# Altium footprint library Molex FFC - FPC Connectors (SMT).PcbLib: 638 footprints (part 24 of 40)
Each footprint in its own frame and in the unit in brackets; x right, y up, seen from the top. Pads: shape width x height; smd on the part's side, far side on the other; paste and mask are expansions set on the pad; w line width, h text height; cw(c..) or ccw(c..) is an arc to the next point about the centre after c.
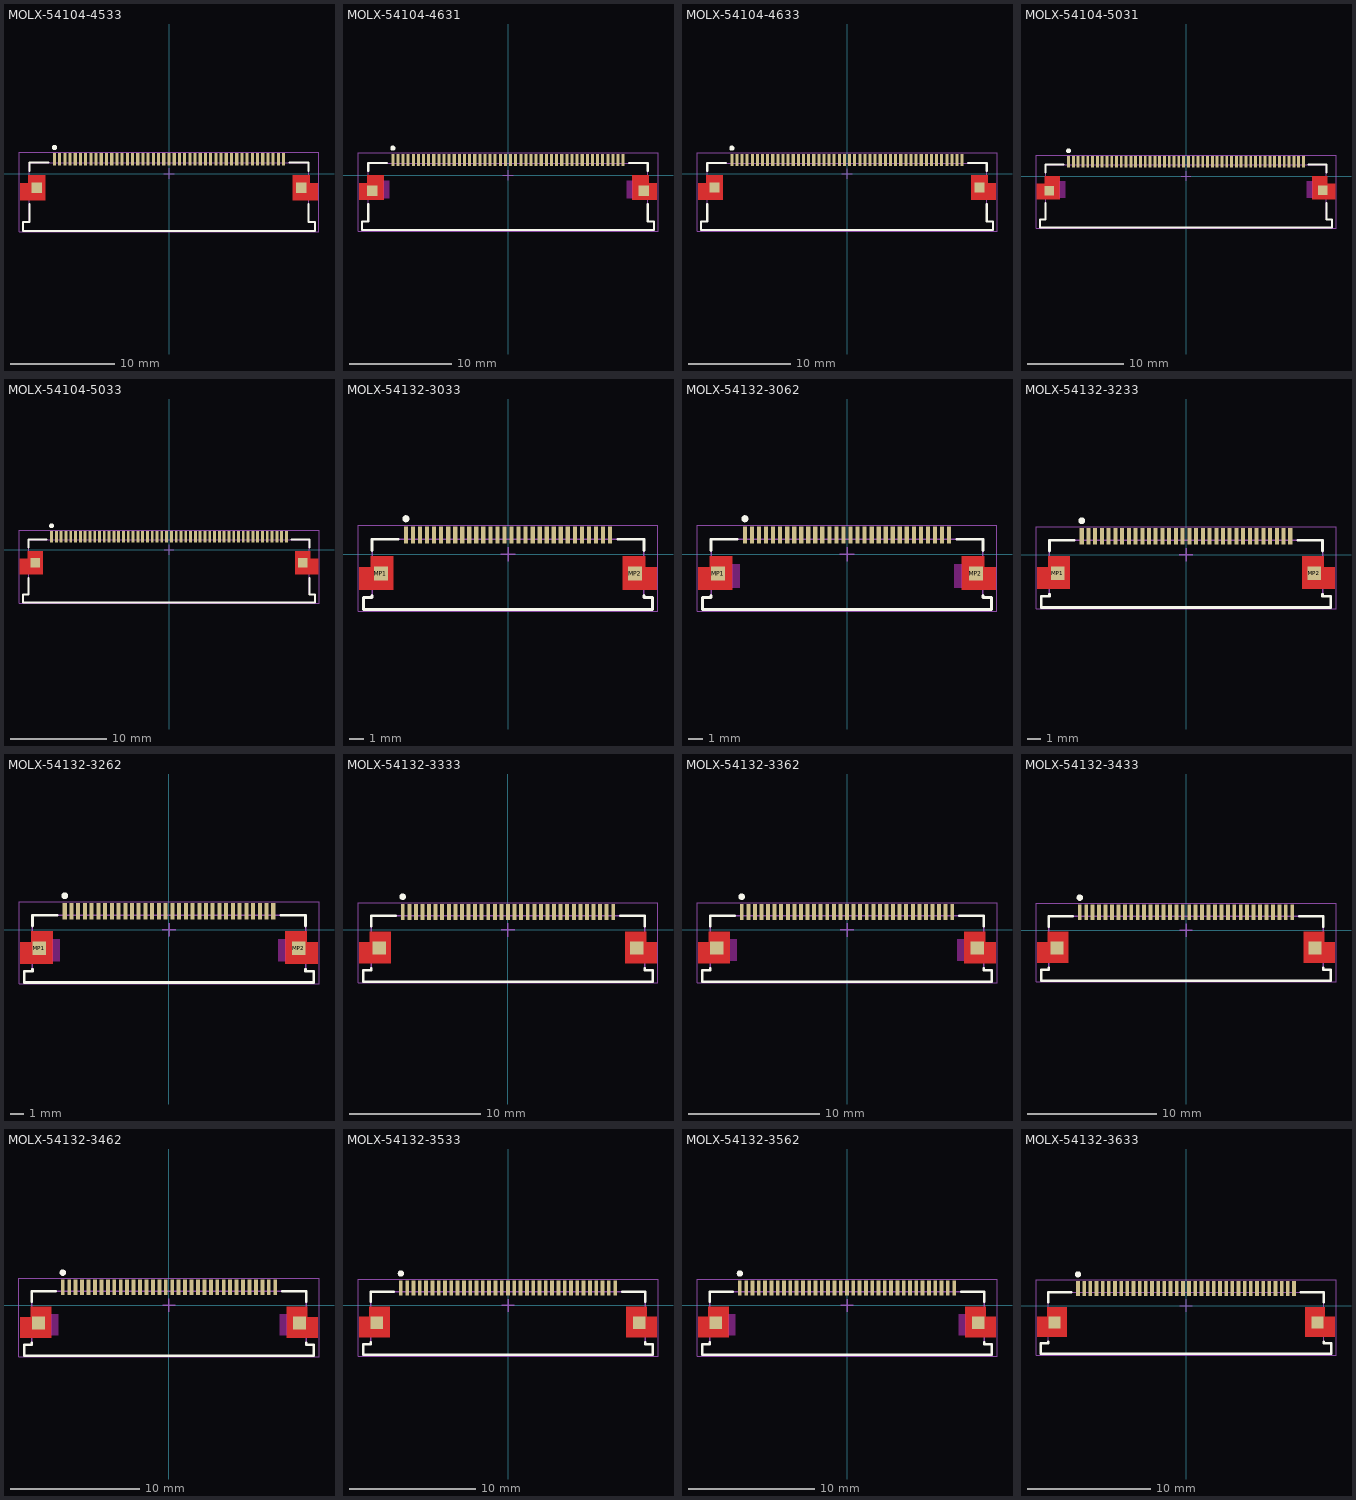
[diagram p23: the footprints below, top view; thin cyan lines are the x and y axes]

## MOLX-54104-4533 [mm] "FPC Connector, 45-Leads, Right Angle, Pitch 0.5 mm, Mated Height 2.0 mm, SMT"
height 2.062
pads (47):
  rect 0.3x1.2 smd: 1(-11,1.35) 2(-10.5,1.35) 3(-10,1.35) 4(-9.5,1.35) 5(-9,1.35) 6(-8.5,1.35) 7(-8,1.35) 8(-7.5,1.35) 9(-7,1.35) 10(-6.5,1.35) 11(-6,1.35) 12(-5.5,1.35) 13(-5,1.35) 14(-4.5,1.35) 15(-4,1.35) 16(-3.5,1.35) 17(-3,1.35) 18(-2.5,1.35) 19(-2,1.35) 20(-1.5,1.35) 21(-1,1.35) 22(-0.5,1.35) 23(0,1.35) 24(0.5,1.35) 25(1,1.35) 26(1.5,1.35) 27(2,1.35) 28(2.5,1.35) 29(3,1.35) 30(3.5,1.35) 31(4,1.35) 32(4.5,1.35) 33(5,1.35) 34(5.5,1.35) 35(6,1.35) 36(6.5,1.35) 37(7,1.35) 38(7.5,1.35) 39(8,1.35) 40(8.5,1.35) 41(9,1.35) 42(9.5,1.35) 43(10,1.35) 44(10.5,1.35) 45(11,1.35)
  rect 1x1 smd mask+0: MP1(-12.7,-1.35) MP2(12.7,-1.35)
Top Layer:
  region: 11.9,-2.55 11.9,-0.15 13.5,-0.15 13.5,-0.95 14.3,-0.95 14.3,-2.55
  region: -11.9,-2.55 -11.9,-0.15 -13.5,-0.15 -13.5,-0.95 -14.3,-0.95 -14.3,-2.55
Top Overlay:
  circle w0.25: c-11,2.5 r0.125
  lines w0.2: -13.4,-2.95 -13.4,-4.65 -14,-4.65 -14,-5.5 14,-5.5 14,-4.65 13.4,-4.65 13.4,-2.95 ; -13.4,0.25 -13.4,1.05 -11.55,1.05 ; 11.55,1.05 13.4,1.05 13.4,0.25
Mechanical 13:
  lines w0.1: -14,-5.5 14,-5.5 14,-4.65 13.4,-4.65 13.4,1.05 -13.4,1.05 -13.4,-4.65 -14,-4.65 -14,-5.5
Mechanical 15:
  lines w0.05: -14.4,-5.6 14.4,-5.6 14.4,2.05 -14.4,2.05 -14.4,-5.6
  lines w0.1: -0.5,0 0.5,0 ; 0,-0.5 0,0.5
3D body: height 0.25, standoff 0, extent -14,-5.5 14,1.65

## MOLX-54104-4631 [mm] "FPC Connector, 46-Leads, Right Angle, Pitch 0.5 mm, Mated Height 2.0 mm, SMT"
height 2.062
pads (48):
  rect 0.3x1.2 smd: 1(-11.25,1.5) 2(-10.75,1.5) 3(-10.25,1.5) 4(-9.75,1.5) 5(-9.25,1.5) 6(-8.75,1.5) 7(-8.25,1.5) 8(-7.75,1.5) 9(-7.25,1.5) 10(-6.75,1.5) 11(-6.25,1.5) 12(-5.75,1.5) 13(-5.25,1.5) 14(-4.75,1.5) 15(-4.25,1.5) 16(-3.75,1.5) 17(-3.25,1.5) 18(-2.75,1.5) 19(-2.25,1.5) 20(-1.75,1.5) 21(-1.25,1.5) 22(-0.75,1.5) 23(-0.25,1.5) 24(0.25,1.5) 25(0.75,1.5) 26(1.25,1.5) 27(1.75,1.5) 28(2.25,1.5) 29(2.75,1.5) 30(3.25,1.5) 31(3.75,1.5) 32(4.25,1.5) 33(4.75,1.5) 34(5.25,1.5) 35(5.75,1.5) 36(6.25,1.5) 37(6.75,1.5) 38(7.25,1.5) 39(7.75,1.5) 40(8.25,1.5) 41(8.75,1.5) 42(9.25,1.5) 43(9.75,1.5) 44(10.25,1.5) 45(10.75,1.5) 46(11.25,1.5)
  rect 1x1 smd: MP1(-13.25,-1.5) MP2(13.25,-1.5)
Top Layer:
  region: -12.15,0 -13.75,0 -13.75,-0.8 -14.55,-0.8 -14.55,-2.4 -12.15,-2.4
  region: 12.15,0 13.75,0 13.75,-0.8 14.55,-0.8 14.55,-2.4 12.15,-2.4
Top Overlay:
  circle w0.25: c-11.25,2.65 r0.125
  lines w0.2: -14.25,-5.35 14.25,-5.35 14.25,-4.5 13.65,-4.5 13.65,-2.8 ; -14.25,-5.35 -14.25,-4.5 -13.65,-4.5 -13.65,-2.8 ; -13.65,0.4 -13.65,1.2 -11.8,1.2 ; 11.8,1.2 13.65,1.2 13.65,0.4
Keep-Out Layer:
  region: -11.6,-0.55 -12.15,-0.55 -12.15,-2.25 -11.6,-2.25
  region: 12.15,-0.55 11.6,-0.55 11.6,-2.25 12.15,-2.25
Mechanical 13:
  lines w0.1: -14.25,-5.35 14.25,-5.35 14.25,-4.5 13.65,-4.5 13.65,1.2 -13.65,1.2 -13.65,-4.5 -14.25,-4.5 -14.25,-5.35
Mechanical 15:
  lines w0.05: -14.65,-5.45 -14.65,2.2 14.65,2.2 14.65,-5.45 -14.65,-5.45
  lines w0.1: -0.5,0 0.5,0 ; 0,-0.5 0,0.5
3D body: height 0.25, standoff 0, extent -14.25,-5.35 14.25,1.8

## MOLX-54104-4633 [mm] "FPC Connector, 46-Leads, Right Angle, Pitch 0.5 mm, Mated Height 2.0 mm, SMT"
height 2.062
pads (48):
  rect 0.3x1.2 smd: 1(-11.25,1.35) 2(-10.75,1.35) 3(-10.25,1.35) 4(-9.75,1.35) 5(-9.25,1.35) 6(-8.75,1.35) 7(-8.25,1.35) 8(-7.75,1.35) 9(-7.25,1.35) 10(-6.75,1.35) 11(-6.25,1.35) 12(-5.75,1.35) 13(-5.25,1.35) 14(-4.75,1.35) 15(-4.25,1.35) 16(-3.75,1.35) 17(-3.25,1.35) 18(-2.75,1.35) 19(-2.25,1.35) 20(-1.75,1.35) 21(-1.25,1.35) 22(-0.75,1.35) 23(-0.25,1.35) 24(0.25,1.35) 25(0.75,1.35) 26(1.25,1.35) 27(1.75,1.35) 28(2.25,1.35) 29(2.75,1.35) 30(3.25,1.35) 31(3.75,1.35) 32(4.25,1.35) 33(4.75,1.35) 34(5.25,1.35) 35(5.75,1.35) 36(6.25,1.35) 37(6.75,1.35) 38(7.25,1.35) 39(7.75,1.35) 40(8.25,1.35) 41(8.75,1.35) 42(9.25,1.35) 43(9.75,1.35) 44(10.25,1.35) 45(10.75,1.35) 46(11.25,1.35)
  rect 1x1 smd mask+0: MP1(-12.95,-1.35) MP2(12.95,-1.35)
Top Layer:
  region: 12.15,-2.55 12.15,-0.15 13.75,-0.15 13.75,-0.95 14.55,-0.95 14.55,-2.55
  region: -12.15,-2.55 -12.15,-0.15 -13.75,-0.15 -13.75,-0.95 -14.55,-0.95 -14.55,-2.55
Top Overlay:
  circle w0.25: c-11.25,2.5 r0.125
  lines w0.2: -13.65,-2.95 -13.65,-4.65 -14.25,-4.65 -14.25,-5.5 14.25,-5.5 14.25,-4.65 13.65,-4.65 13.65,-2.95 ; -13.65,0.25 -13.65,1.05 -11.8,1.05 ; 11.8,1.05 13.65,1.05 13.65,0.25
Mechanical 13:
  lines w0.1: -14.25,-5.5 14.25,-5.5 14.25,-4.65 13.65,-4.65 13.65,1.05 -13.65,1.05 -13.65,-4.65 -14.25,-4.65 -14.25,-5.5
Mechanical 15:
  lines w0.05: -14.65,-5.6 14.65,-5.6 14.65,2.05 -14.65,2.05 -14.65,-5.6
  lines w0.1: -0.5,0 0.5,0 ; 0,-0.5 0,0.5
3D body: height 0.25, standoff 0, extent -14.25,-5.5 14.25,1.65

## MOLX-54104-5031 [mm] "FPC Connector, 50-Leads, Right Angle, Pitch 0.5 mm, Mated Height 2.0 mm, SMT"
height 2.062
pads (52):
  rect 0.3x1.2 smd: 1(-12.25,1.5) 2(-11.75,1.5) 3(-11.25,1.5) 4(-10.75,1.5) 5(-10.25,1.5) 6(-9.75,1.5) 7(-9.25,1.5) 8(-8.75,1.5) 9(-8.25,1.5) 10(-7.75,1.5) 11(-7.25,1.5) 12(-6.75,1.5) 13(-6.25,1.5) 14(-5.75,1.5) 15(-5.25,1.5) 16(-4.75,1.5) 17(-4.25,1.5) 18(-3.75,1.5) 19(-3.25,1.5) 20(-2.75,1.5) 21(-2.25,1.5) 22(-1.75,1.5) 23(-1.25,1.5) 24(-0.75,1.5) 25(-0.25,1.5) 26(0.25,1.5) 27(0.75,1.5) 28(1.25,1.5) 29(1.75,1.5) 30(2.25,1.5) 31(2.75,1.5) 32(3.25,1.5) 33(3.75,1.5) 34(4.25,1.5) 35(4.75,1.5) 36(5.25,1.5) 37(5.75,1.5) 38(6.25,1.5) 39(6.75,1.5) 40(7.25,1.5) 41(7.75,1.5) 42(8.25,1.5) 43(8.75,1.5) 44(9.25,1.5) 45(9.75,1.5) 46(10.25,1.5) 47(10.75,1.5) 48(11.25,1.5) 49(11.75,1.5) 50(12.25,1.5)
  rect 1x1 smd: MP1(-14.25,-1.5) MP2(14.25,-1.475)
Top Layer:
  region: 13.15,0 14.75,0 14.75,-0.8 15.55,-0.8 15.55,-2.4 13.15,-2.4
  region: -13.15,0 -14.75,0 -14.75,-0.8 -15.55,-0.8 -15.55,-2.4 -13.15,-2.4
Top Overlay:
  circle w0.25: c-12.25,2.65 r0.125
  lines w0.2: -15.25,-5.35 15.25,-5.35 15.25,-4.5 14.65,-4.5 14.65,-2.8 ; -15.25,-5.35 -15.25,-4.5 -14.65,-4.5 -14.65,-2.8 ; -14.65,0.4 -14.65,1.2 -12.8,1.2 ; 12.8,1.2 14.65,1.2 14.65,0.4
Keep-Out Layer:
  region: 13.15,-0.55 12.6,-0.55 12.6,-2.25 13.15,-2.25
  region: -12.6,-0.55 -13.15,-0.55 -13.15,-2.25 -12.6,-2.25
Mechanical 13:
  lines w0.1: -15.25,-5.35 -15.25,-4.5 -14.65,-4.5 -14.65,1.2 14.65,1.2 14.65,-4.5 15.25,-4.5 15.25,-5.35 -15.25,-5.35
Mechanical 15:
  lines w0.05: -15.65,-5.45 15.65,-5.45 15.65,2.2 -15.65,2.2 -15.65,-5.45
  lines w0.1: -0.5,0 0.5,0 ; 0,-0.5 0,0.5
3D body: height 0.25, standoff 0, extent -15.25,-5.35 15.25,1.8

## MOLX-54104-5033 [mm] "FPC Connector, 50-Leads, Right Angle, Pitch 0.5 mm, Mated Height 2.0 mm, SMT"
height 2.062
pads (52):
  rect 0.3x1.2 smd: 1(-12.25,1.35) 2(-11.75,1.35) 3(-11.25,1.35) 4(-10.75,1.35) 5(-10.25,1.35) 6(-9.75,1.35) 7(-9.25,1.35) 8(-8.75,1.35) 9(-8.25,1.35) 10(-7.75,1.35) 11(-7.25,1.35) 12(-6.75,1.35) 13(-6.25,1.35) 14(-5.75,1.35) 15(-5.25,1.35) 16(-4.75,1.35) 17(-4.25,1.35) 18(-3.75,1.35) 19(-3.25,1.35) 20(-2.75,1.35) 21(-2.25,1.35) 22(-1.75,1.35) 23(-1.25,1.35) 24(-0.75,1.35) 25(-0.25,1.35) 26(0.25,1.35) 27(0.75,1.35) 28(1.25,1.35) 29(1.75,1.35) 30(2.25,1.35) 31(2.75,1.35) 32(3.25,1.35) 33(3.75,1.35) 34(4.25,1.35) 35(4.75,1.35) 36(5.25,1.35) 37(5.75,1.35) 38(6.25,1.35) 39(6.75,1.35) 40(7.25,1.35) 41(7.75,1.35) 42(8.25,1.35) 43(8.75,1.35) 44(9.25,1.35) 45(9.75,1.35) 46(10.25,1.35) 47(10.75,1.35) 48(11.25,1.35) 49(11.75,1.35) 50(12.25,1.35)
  rect 1x1 smd mask+0: MP1(-13.95,-1.35) MP2(13.95,-1.35)
Top Layer:
  region: -13.15,-2.55 -13.15,-0.15 -14.75,-0.15 -14.75,-0.95 -15.55,-0.95 -15.55,-2.55
  region: 13.15,-2.55 13.15,-0.15 14.75,-0.15 14.75,-0.95 15.55,-0.95 15.55,-2.55
Top Overlay:
  circle w0.25: c-12.25,2.5 r0.125
  lines w0.2: -14.65,-2.95 -14.65,-4.65 -15.25,-4.65 -15.25,-5.5 15.25,-5.5 15.25,-4.65 14.65,-4.65 14.65,-2.95 ; -14.65,0.25 -14.65,1.05 -12.8,1.05 ; 12.8,1.05 14.65,1.05 14.65,0.25
Mechanical 13:
  lines w0.1: -15.25,-5.5 -15.25,-4.65 -14.65,-4.65 -14.65,1.05 14.65,1.05 14.65,-4.65 15.25,-4.65 15.25,-5.5 -15.25,-5.5
Mechanical 15:
  lines w0.05: -15.65,-5.6 -15.65,2.05 15.65,2.05 15.65,-5.6 -15.65,-5.6
  lines w0.1: -0.5,0 0.5,0 ; 0,-0.5 0,0.5
3D body: height 0.25, standoff 0, extent -15.25,-5.5 15.25,1.65

## MOLX-54132-3033 [mm] "FPC Connector, 30-Leads, Right Angle, Pitch 0.5 mm, Mated Height 2.0 mm, SMT"
height 2.002
pads (32):
  rect 0.3x1.2 smd: 1(-7.25,1.373) 2(-6.75,1.373) 3(-6.25,1.373) 4(-5.75,1.373) 5(-5.25,1.373) 6(-4.75,1.373) 7(-4.25,1.373) 8(-3.75,1.373) 9(-3.25,1.373) 10(-2.75,1.373) 11(-2.25,1.373) 12(-1.75,1.373) 13(-1.25,1.373) 14(-0.75,1.373) 15(-0.25,1.373) 16(0.25,1.373) 17(0.75,1.373) 18(1.25,1.373) 19(1.75,1.373) 20(2.25,1.373) 21(2.75,1.373) 22(3.25,1.373) 23(3.75,1.373) 24(4.25,1.373) 25(4.75,1.373) 26(5.25,1.373) 27(5.75,1.373) 28(6.25,1.373) 29(6.75,1.373) 30(7.25,1.373)
  rect 1x1 smd: MP1(-9.017,-1.373) MP2(9.017,-1.373)
Top Layer:
  region: 9.75,-0.126 8.15,-0.126 8.15,-2.526 10.55,-2.526 10.55,-0.927 9.75,-0.927
  region: -9.75,-0.126 -8.15,-0.126 -8.15,-2.526 -10.55,-2.526 -10.55,-0.927 -9.75,-0.927
Top Overlay:
  circle w0.25: c-7.25,2.524 r0.125
  lines w0.2: -9.65,-2.926 -9.65,-3.076 -10.25,-3.076 -10.25,-3.927 10.25,-3.926 ; -9.65,0.274 -9.65,1.074 -7.8,1.074 ; 7.8,1.074 9.65,1.074 9.65,0.274 ; 9.65,-2.926 9.65,-3.076 10.25,-3.076 10.25,-3.926
Mechanical 13:
  lines w0.1: -9.702,-3.076 -10.25,-3.076 -10.25,-3.927 10.25,-3.926 10.25,-3.076 9.65,-3.076 9.65,1.074 -9.65,1.074 -9.65,-3.076
Mechanical 15:
  lines w0.05: -10.65,-4.026 10.65,-4.026 10.65,2.074 -10.65,2.074 -10.65,-4.026
  lines w0.1: -0.5,0 0.5,0 ; 0,-0.5 0,0.5
3D body: height 0.25, standoff 0, extent -10.25,-3.926 10.25,1.674

## MOLX-54132-3062 [mm] "FPC Connector, 30-Leads, Right Angle, Pitch 0.5 mm, Mated Height 2.0 mm, SMT"
height 2.002
pads (32):
  rect 0.3x1.2 smd: 1(-7.25,1.375) 2(-6.75,1.375) 3(-6.25,1.375) 4(-5.75,1.375) 5(-5.25,1.375) 6(-4.75,1.375) 7(-4.25,1.375) 8(-3.75,1.375) 9(-3.25,1.375) 10(-2.75,1.375) 11(-2.25,1.375) 12(-1.75,1.375) 13(-1.25,1.375) 14(-0.75,1.375) 15(-0.25,1.375) 16(0.25,1.375) 17(0.75,1.375) 18(1.25,1.375) 19(1.75,1.375) 20(2.25,1.375) 21(2.75,1.375) 22(3.25,1.375) 23(3.75,1.375) 24(4.25,1.375) 25(4.75,1.375) 26(5.25,1.375) 27(5.75,1.375) 28(6.25,1.375) 29(6.75,1.375) 30(7.25,1.375)
  rect 1x1 smd: MP1(-9.15,-1.375) MP2(9.15,-1.375)
Top Layer:
  region: 8.15,-0.125 9.75,-0.125 9.75,-0.925 10.55,-0.925 10.55,-2.525 8.15,-2.525
  region: -8.15,-0.125 -9.75,-0.125 -9.75,-0.925 -10.55,-0.925 -10.55,-2.525 -8.15,-2.525
Top Overlay:
  circle w0.25: c-7.25,2.525 r0.125
  lines w0.2: -9.65,-2.925 -9.65,-3.075 -10.25,-3.075 -10.25,-3.925 10.25,-3.925 10.25,-3.075 9.65,-3.075 9.65,-2.925 ; -9.65,0.275 -9.65,1.075 -7.8,1.075 ; 7.8,1.075 9.65,1.075 9.65,0.275
Keep-Out Layer:
  rectangle: 7.6,-2.375 8.15,-0.675
  region: -7.6,-0.675 -8.15,-0.675 -8.15,-2.375 -7.6,-2.375
Mechanical 13:
  lines w0.1: -10.25,-3.925 -10.25,-3.075 -9.65,-3.075 -9.65,1.075 9.65,1.075 9.65,-3.075 10.25,-3.075 10.25,-3.925 -10.25,-3.925
Mechanical 15:
  lines w0.05: -10.65,-4.025 10.65,-4.025 10.65,2.075 -10.65,2.075 -10.65,-4.025
  lines w0.1: -0.5,0 0.5,0 ; 0,-0.5 0,0.5
3D body: height 0.25, standoff 0, extent -10.25,-3.925 10.25,1.675

## MOLX-54132-3233 [mm] "FPC Connector, 32-Leads, Right Angle, Pitch 0.5 mm, Mated Height 2.0 mm, SMT"
height 2.002
pads (34):
  rect 0.3x1.2 smd: 1(-7.75,1.373) 2(-7.25,1.373) 3(-6.75,1.373) 4(-6.25,1.373) 5(-5.75,1.373) 6(-5.25,1.373) 7(-4.75,1.373) 8(-4.25,1.373) 9(-3.75,1.373) 10(-3.25,1.373) 11(-2.75,1.373) 12(-2.25,1.373) 13(-1.75,1.373) 14(-1.25,1.373) 15(-0.75,1.373) 16(-0.25,1.373) 17(0.25,1.373) 18(0.75,1.373) 19(1.25,1.373) 20(1.75,1.373) 21(2.25,1.373) 22(2.75,1.373) 23(3.25,1.373) 24(3.75,1.373) 25(4.25,1.373) 26(4.75,1.373) 27(5.25,1.373) 28(5.75,1.373) 29(6.25,1.373) 30(6.75,1.373) 31(7.25,1.373) 32(7.75,1.373)
  rect 1x1 smd: MP1(-9.525,-1.373) MP2(9.525,-1.373)
Top Layer:
  region: -10.25,-0.126 -8.65,-0.126 -8.65,-2.526 -11.05,-2.526 -11.05,-0.927 -10.25,-0.927
  region: 10.25,-0.126 8.65,-0.126 8.65,-2.526 11.05,-2.526 11.05,-0.927 10.25,-0.927
Top Overlay:
  circle w0.25: c-7.75,2.524 r0.125
  lines w0.2: -10.15,-2.926 -10.15,-3.076 -10.75,-3.076 -10.75,-3.927 10.75,-3.926 ; -10.15,0.274 -10.15,1.074 -8.3,1.074 ; 8.3,1.074 10.15,1.074 10.15,0.274 ; 10.15,-2.926 10.15,-3.076 10.75,-3.076 10.75,-3.926
Mechanical 13:
  lines w0.1: -10.202,-3.076 -10.75,-3.076 -10.75,-3.927 10.75,-3.926 10.75,-3.076 10.15,-3.076 10.15,1.074 -10.15,1.074 -10.15,-3.076
Mechanical 15:
  lines w0.05: -11.15,-4.026 -11.15,2.074 11.15,2.074 11.15,-4.026 -11.15,-4.026
  lines w0.1: -0.5,0 0.5,0 ; 0,-0.5 0,0.5
3D body: height 0.25, standoff 0, extent -10.75,-3.926 10.75,1.674

## MOLX-54132-3262 [mm] "FPC Connector, 32-Leads, Right Angle, Pitch 0.5 mm, Mated Height 2.0 mm, SMT"
height 2.002
pads (34):
  rect 0.3x1.2 smd: 1(-7.75,1.375) 2(-7.25,1.375) 3(-6.75,1.375) 4(-6.25,1.375) 5(-5.75,1.375) 6(-5.25,1.375) 7(-4.75,1.375) 8(-4.25,1.375) 9(-3.75,1.375) 10(-3.25,1.375) 11(-2.75,1.375) 12(-2.25,1.375) 13(-1.75,1.375) 14(-1.25,1.375) 15(-0.75,1.375) 16(-0.25,1.375) 17(0.25,1.375) 18(0.75,1.375) 19(1.25,1.375) 20(1.75,1.375) 21(2.25,1.375) 22(2.75,1.375) 23(3.25,1.375) 24(3.75,1.375) 25(4.25,1.375) 26(4.75,1.375) 27(5.25,1.375) 28(5.75,1.375) 29(6.25,1.375) 30(6.75,1.375) 31(7.25,1.375) 32(7.75,1.375)
  rect 1x1 smd: MP1(-9.65,-1.375) MP2(9.65,-1.375)
Top Layer:
  region: -8.65,-0.125 -10.25,-0.125 -10.25,-0.925 -11.05,-0.925 -11.05,-2.525 -8.65,-2.525
  region: 8.65,-0.125 10.25,-0.125 10.25,-0.925 11.05,-0.925 11.05,-2.525 8.65,-2.525
Top Overlay:
  circle w0.25: c-7.75,2.525 r0.125
  lines w0.2: -10.15,-2.925 -10.15,-3.075 -10.75,-3.075 -10.75,-3.925 10.75,-3.925 10.75,-3.075 10.15,-3.075 10.15,-2.925 ; -10.15,0.275 -10.15,1.075 -8.3,1.075 ; 8.3,1.075 10.15,1.075 10.15,0.275
Keep-Out Layer:
  region: -8.1,-0.675 -8.65,-0.675 -8.65,-2.375 -8.1,-2.375
  rectangle: 8.1,-2.375 8.65,-0.675
Mechanical 13:
  lines w0.1: -10.75,-3.925 10.75,-3.925 10.75,-3.075 10.15,-3.075 10.15,1.075 -10.15,1.075 -10.15,-3.075 -10.75,-3.075 -10.75,-3.925
Mechanical 15:
  lines w0.05: -11.15,-4.025 -11.15,2.075 11.15,2.075 11.15,-4.025 -11.15,-4.025
  lines w0.1: -0.5,0 0.5,0 ; 0,-0.5 0,0.5
3D body: height 0.25, standoff 0, extent -10.75,-3.925 10.75,1.675

## MOLX-54132-3333 [mm] "FPC Connector, 33-Leads, Right Angle, Pitch 0.5 mm, Mated Height 2.0 mm, SMT"
height 2.002
pads (35):
  rect 0.3x1.2 smd: 1(-8,1.373) 2(-7.5,1.373) 3(-7,1.373) 4(-6.5,1.373) 5(-6,1.373) 6(-5.5,1.373) 7(-5,1.373) 8(-4.5,1.373) 9(-4,1.373) 10(-3.5,1.373) 11(-3,1.373) 12(-2.5,1.373) 13(-2,1.373) 14(-1.5,1.373) 15(-1,1.373) 16(-0.5,1.373) 17(0,1.373) 18(0.5,1.373) 19(1,1.373) 20(1.5,1.373) 21(2,1.373) 22(2.5,1.373) 23(3,1.373) 24(3.5,1.373) 25(4,1.373) 26(4.5,1.373) 27(5,1.373) 28(5.5,1.373) 29(6,1.373) 30(6.5,1.373) 31(7,1.373) 32(7.5,1.373) 33(8,1.373)
  rect 1x1 smd: MP1(-9.779,-1.373) MP2(9.779,-1.373)
Top Layer:
  region: 10.5,-0.126 8.9,-0.126 8.9,-2.526 11.3,-2.526 11.3,-0.927 10.5,-0.927
  region: -10.5,-0.126 -8.9,-0.126 -8.9,-2.526 -11.3,-2.526 -11.3,-0.927 -10.5,-0.927
Top Overlay:
  circle w0.25: c-8,2.524 r0.125
  lines w0.2: -10.4,-2.926 -10.4,-3.076 -11,-3.076 -11,-3.927 11,-3.926 ; -10.4,0.274 -10.4,1.074 -8.55,1.074 ; 8.55,1.074 10.4,1.074 10.4,0.274 ; 10.4,-2.926 10.4,-3.076 11,-3.076 11,-3.926
Mechanical 13:
  lines w0.1: -10.452,-3.076 -11,-3.076 -11,-3.927 11,-3.926 11,-3.076 10.4,-3.076 10.4,1.074 -10.4,1.074 -10.4,-3.076
Mechanical 15:
  lines w0.05: -11.4,-4.026 11.4,-4.026 11.4,2.074 -11.4,2.074 -11.4,-4.026
  lines w0.1: -0.5,0 0.5,0 ; 0,-0.5 0,0.5
3D body: height 0.25, standoff 0, extent -11,-3.926 11,1.674

## MOLX-54132-3362 [mm] "FPC Connector, 33-Leads, Right Angle, Pitch 0.5 mm, Mated Height 2.0 mm, SMT"
height 2.002
pads (35):
  rect 0.3x1.2 smd: 1(-8,1.375) 2(-7.5,1.375) 3(-7,1.375) 4(-6.5,1.375) 5(-6,1.375) 6(-5.5,1.375) 7(-5,1.375) 8(-4.5,1.375) 9(-4,1.375) 10(-3.5,1.375) 11(-3,1.375) 12(-2.5,1.375) 13(-2,1.375) 14(-1.5,1.375) 15(-1,1.375) 16(-0.5,1.375) 17(0,1.375) 18(0.5,1.375) 19(1,1.375) 20(1.5,1.375) 21(2,1.375) 22(2.5,1.375) 23(3,1.375) 24(3.5,1.375) 25(4,1.375) 26(4.5,1.375) 27(5,1.375) 28(5.5,1.375) 29(6,1.375) 30(6.5,1.375) 31(7,1.375) 32(7.5,1.375) 33(8,1.375)
  rect 1x1 smd: MP1(-9.9,-1.375) MP2(9.9,-1.375)
Top Layer:
  region: 8.9,-0.125 10.5,-0.125 10.5,-0.925 11.3,-0.925 11.3,-2.525 8.9,-2.525
  region: -8.9,-0.125 -10.5,-0.125 -10.5,-0.925 -11.3,-0.925 -11.3,-2.525 -8.9,-2.525
Top Overlay:
  circle w0.25: c-8,2.525 r0.125
  lines w0.2: -10.4,-2.925 -10.4,-3.075 -11,-3.075 -11,-3.925 11,-3.925 11,-3.075 10.4,-3.075 10.4,-2.925 ; -10.4,0.275 -10.4,1.075 -8.55,1.075 ; 8.55,1.075 10.4,1.075 10.4,0.275
Keep-Out Layer:
  rectangle: 8.35,-2.375 8.9,-0.675
  region: -8.35,-0.675 -8.9,-0.675 -8.9,-2.375 -8.35,-2.375
Mechanical 13:
  lines w0.1: -11,-3.925 -11,-3.075 -10.4,-3.075 -10.4,1.075 10.4,1.075 10.4,-3.075 11,-3.075 11,-3.925 -11,-3.925
Mechanical 15:
  lines w0.05: -11.4,-4.025 11.4,-4.025 11.4,2.075 -11.4,2.075 -11.4,-4.025
  lines w0.1: -0.5,0 0.5,0 ; 0,-0.5 0,0.5
3D body: height 0.25, standoff 0, extent -11,-3.925 11,1.675

## MOLX-54132-3433 [mm] "FPC Connector, 34-Leads, Right Angle, Pitch 0.5 mm, Mated Height 2.0 mm, SMT"
height 2.002
pads (36):
  rect 0.3x1.2 smd: 1(-8.25,1.373) 2(-7.75,1.373) 3(-7.25,1.373) 4(-6.75,1.373) 5(-6.25,1.373) 6(-5.75,1.373) 7(-5.25,1.373) 8(-4.75,1.373) 9(-4.25,1.373) 10(-3.75,1.373) 11(-3.25,1.373) 12(-2.75,1.373) 13(-2.25,1.373) 14(-1.75,1.373) 15(-1.25,1.373) 16(-0.75,1.373) 17(-0.25,1.373) 18(0.25,1.373) 19(0.75,1.373) 20(1.25,1.373) 21(1.75,1.373) 22(2.25,1.373) 23(2.75,1.373) 24(3.25,1.373) 25(3.75,1.373) 26(4.25,1.373) 27(4.75,1.373) 28(5.25,1.373) 29(5.75,1.373) 30(6.25,1.373) 31(6.75,1.373) 32(7.25,1.373) 33(7.75,1.373) 34(8.25,1.373)
  rect 1x1 smd: MP1(-10.033,-1.373) MP2(10.033,-1.373)
Top Layer:
  region: -10.75,-0.126 -9.15,-0.126 -9.15,-2.526 -11.55,-2.526 -11.55,-0.927 -10.75,-0.927
  region: 10.75,-0.126 9.15,-0.126 9.15,-2.526 11.55,-2.526 11.55,-0.927 10.75,-0.927
Top Overlay:
  circle w0.25: c-8.25,2.524 r0.125
  lines w0.2: -10.65,-2.926 -10.65,-3.076 -11.25,-3.076 -11.25,-3.927 11.25,-3.926 ; -10.65,0.274 -10.65,1.074 -8.8,1.074 ; 8.8,1.074 10.65,1.074 10.65,0.274 ; 10.65,-2.926 10.65,-3.076 11.25,-3.076 11.25,-3.926
Mechanical 13:
  lines w0.1: -10.702,-3.076 -11.25,-3.076 -11.25,-3.927 11.25,-3.926 11.25,-3.076 10.65,-3.076 10.65,1.074 -10.65,1.074 -10.65,-3.076
Mechanical 15:
  lines w0.05: -11.65,-4.026 -11.65,2.074 11.65,2.074 11.65,-4.026 -11.65,-4.026
  lines w0.1: -0.5,0 0.5,0 ; 0,-0.5 0,0.5
3D body: height 0.25, standoff 0, extent -11.25,-3.926 11.25,1.674

## MOLX-54132-3462 [mm] "FPC Connector, 34-Leads, Right Angle, Pitch 0.5 mm, Mated Height 2.0 mm, SMT"
height 2.002
pads (36):
  rect 0.3x1.2 smd: 1(-8.25,1.375) 2(-7.75,1.375) 3(-7.25,1.375) 4(-6.75,1.375) 5(-6.25,1.375) 6(-5.75,1.375) 7(-5.25,1.375) 8(-4.75,1.375) 9(-4.25,1.375) 10(-3.75,1.375) 11(-3.25,1.375) 12(-2.75,1.375) 13(-2.25,1.375) 14(-1.75,1.375) 15(-1.25,1.375) 16(-0.75,1.375) 17(-0.25,1.375) 18(0.25,1.375) 19(0.75,1.375) 20(1.25,1.375) 21(1.75,1.375) 22(2.25,1.375) 23(2.75,1.375) 24(3.25,1.375) 25(3.75,1.375) 26(4.25,1.375) 27(4.75,1.375) 28(5.25,1.375) 29(5.75,1.375) 30(6.25,1.375) 31(6.75,1.375) 32(7.25,1.375) 33(7.75,1.375) 34(8.25,1.375)
  rect 1x1 smd: MP1(-10.15,-1.375) MP2(10.15,-1.375)
Top Layer:
  region: 9.15,-0.125 10.75,-0.125 10.75,-0.925 11.55,-0.925 11.55,-2.525 9.15,-2.525
  region: -9.15,-0.125 -10.75,-0.125 -10.75,-0.925 -11.55,-0.925 -11.55,-2.525 -9.15,-2.525
Top Overlay:
  circle w0.25: c-8.25,2.525 r0.125
  lines w0.2: -10.65,-2.925 -10.65,-3.075 -11.25,-3.075 -11.25,-3.925 11.25,-3.925 11.25,-3.075 10.65,-3.075 10.65,-2.925 ; -10.65,0.275 -10.65,1.075 -8.8,1.075 ; 8.8,1.075 10.65,1.075 10.65,0.275
Keep-Out Layer:
  rectangle: 8.6,-2.375 9.15,-0.675
  region: -8.6,-0.675 -9.15,-0.675 -9.15,-2.375 -8.6,-2.375
Mechanical 13:
  lines w0.1: -11.25,-3.925 -11.25,-3.075 -10.65,-3.075 -10.65,1.075 10.65,1.075 10.65,-3.075 11.25,-3.075 11.25,-3.925 -11.25,-3.925
Mechanical 15:
  lines w0.05: -11.65,-4.025 11.65,-4.025 11.65,2.075 -11.65,2.075 -11.65,-4.025
  lines w0.1: -0.5,0 0.5,0 ; 0,-0.5 0,0.5
3D body: height 0.25, standoff 0, extent -11.25,-3.925 11.25,1.675

## MOLX-54132-3533 [mm] "FPC Connector, 35-Leads, Right Angle, Pitch 0.5 mm, Mated Height 2.0 mm, SMT"
height 2.002
pads (37):
  rect 0.3x1.2 smd: 1(-8.5,1.375) 2(-8,1.375) 3(-7.5,1.375) 4(-7,1.375) 5(-6.5,1.375) 6(-6,1.375) 7(-5.5,1.375) 8(-5,1.375) 9(-4.5,1.375) 10(-4,1.375) 11(-3.5,1.375) 12(-3,1.375) 13(-2.5,1.375) 14(-2,1.375) 15(-1.5,1.375) 16(-1,1.375) 17(-0.5,1.375) 18(0,1.375) 19(0.5,1.375) 20(1,1.375) 21(1.5,1.375) 22(2,1.375) 23(2.5,1.375) 24(3,1.375) 25(3.5,1.375) 26(4,1.375) 27(4.5,1.375) 28(5,1.375) 29(5.5,1.375) 30(6,1.375) 31(6.5,1.375) 32(7,1.375) 33(7.5,1.375) 34(8,1.375) 35(8.5,1.375)
  rect 1x1 smd: MP1(-10.4,-1.375) MP2(10.4,-1.375)
Top Layer:
  region: -9.4,-0.125 -11,-0.125 -11,-0.925 -11.8,-0.925 -11.8,-2.525 -9.4,-2.525
  region: 9.4,-0.125 11,-0.125 11,-0.925 11.8,-0.925 11.8,-2.525 9.4,-2.525
Top Overlay:
  circle w0.25: c-8.5,2.525 r0.125
  lines w0.2: -10.9,-2.925 -10.9,-3.075 -11.5,-3.075 -11.5,-3.925 11.5,-3.925 11.5,-3.075 10.9,-3.075 10.9,-2.925 ; -10.9,0.275 -10.9,1.075 -9.05,1.075 ; 9.05,1.075 10.9,1.075 10.9,0.275
Mechanical 13:
  lines w0.1: -11.5,-3.925 11.5,-3.925 11.5,-3.075 10.9,-3.075 10.9,1.075 -10.9,1.075 -10.9,-3.075 -11.5,-3.075 -11.5,-3.925
Mechanical 15:
  lines w0.05: -11.9,-4.025 -11.9,2.075 11.9,2.075 11.9,-4.025 -11.9,-4.025
  lines w0.1: -0.5,0 0.5,0 ; 0,-0.5 0,0.5
3D body: height 0.25, standoff 0, extent -11.5,-3.925 11.5,1.675

## MOLX-54132-3562 [mm] "FPC Connector, 35-Leads, Right Angle, Pitch 0.5 mm, Mated Height 2.0 mm, SMT"
height 2.002
pads (37):
  rect 0.3x1.2 smd: 1(-8.5,1.375) 2(-8,1.375) 3(-7.5,1.375) 4(-7,1.375) 5(-6.5,1.375) 6(-6,1.375) 7(-5.5,1.375) 8(-5,1.375) 9(-4.5,1.375) 10(-4,1.375) 11(-3.5,1.375) 12(-3,1.375) 13(-2.5,1.375) 14(-2,1.375) 15(-1.5,1.375) 16(-1,1.375) 17(-0.5,1.375) 18(0,1.375) 19(0.5,1.375) 20(1,1.375) 21(1.5,1.375) 22(2,1.375) 23(2.5,1.375) 24(3,1.375) 25(3.5,1.375) 26(4,1.375) 27(4.5,1.375) 28(5,1.375) 29(5.5,1.375) 30(6,1.375) 31(6.5,1.375) 32(7,1.375) 33(7.5,1.375) 34(8,1.375) 35(8.5,1.375)
  rect 1x1 smd: MP1(-10.4,-1.375) MP2(10.4,-1.375)
Top Layer:
  region: 9.4,-0.125 11,-0.125 11,-0.925 11.8,-0.925 11.8,-2.525 9.4,-2.525
  region: -9.4,-0.125 -11,-0.125 -11,-0.925 -11.8,-0.925 -11.8,-2.525 -9.4,-2.525
Top Overlay:
  circle w0.25: c-8.5,2.525 r0.125
  lines w0.2: -10.9,-2.925 -10.9,-3.075 -11.5,-3.075 -11.5,-3.925 11.5,-3.925 11.5,-3.075 10.9,-3.075 10.9,-2.925 ; -10.9,0.275 -10.9,1.075 -9.05,1.075 ; 9.05,1.075 10.9,1.075 10.9,0.275
Keep-Out Layer:
  rectangle: 8.85,-2.375 9.4,-0.675
  region: -8.85,-0.675 -9.4,-0.675 -9.4,-2.375 -8.85,-2.375
Mechanical 13:
  lines w0.1: -11.5,-3.925 -11.5,-3.075 -10.9,-3.075 -10.9,1.075 10.9,1.075 10.9,-3.075 11.5,-3.075 11.5,-3.925 -11.5,-3.925
Mechanical 15:
  lines w0.05: -11.9,-4.025 11.9,-4.025 11.9,2.075 -11.9,2.075 -11.9,-4.025
  lines w0.1: -0.5,0 0.5,0 ; 0,-0.5 0,0.5
3D body: height 0.25, standoff 0, extent -11.5,-3.925 11.5,1.675

## MOLX-54132-3633 [mm] "FPC Connector, 36-Leads, Right Angle, Pitch 0.5 mm, Mated Height 2.0 mm, SMT"
height 2.002
pads (38):
  rect 0.3x1.2 smd: 1(-8.75,1.375) 2(-8.25,1.375) 3(-7.75,1.375) 4(-7.25,1.375) 5(-6.75,1.375) 6(-6.25,1.375) 7(-5.75,1.375) 8(-5.25,1.375) 9(-4.75,1.375) 10(-4.25,1.375) 11(-3.75,1.375) 12(-3.25,1.375) 13(-2.75,1.375) 14(-2.25,1.375) 15(-1.75,1.375) 16(-1.25,1.375) 17(-0.75,1.375) 18(-0.25,1.375) 19(0.25,1.375) 20(0.75,1.375) 21(1.25,1.375) 22(1.75,1.375) 23(2.25,1.375) 24(2.75,1.375) 25(3.25,1.375) 26(3.75,1.375) 27(4.25,1.375) 28(4.75,1.375) 29(5.25,1.375) 30(5.75,1.375) 31(6.25,1.375) 32(6.75,1.375) 33(7.25,1.375) 34(7.75,1.375) 35(8.25,1.375) 36(8.75,1.375)
  rect 1x1 smd: MP1(-10.65,-1.375) MP2(10.65,-1.375)
Top Layer:
  region: 9.65,-0.125 11.25,-0.125 11.25,-0.925 12.05,-0.925 12.05,-2.525 9.65,-2.525
  region: -9.65,-0.125 -11.25,-0.125 -11.25,-0.925 -12.05,-0.925 -12.05,-2.525 -9.65,-2.525
Top Overlay:
  circle w0.25: c-8.75,2.525 r0.125
  lines w0.2: -11.15,-2.925 -11.15,-3.075 -11.75,-3.075 -11.75,-3.925 11.75,-3.925 11.75,-3.075 11.15,-3.075 11.15,-2.925 ; -11.15,0.275 -11.15,1.075 -9.3,1.075 ; 9.3,1.075 11.15,1.075 11.15,0.275
Mechanical 13:
  lines w0.1: -11.75,-3.925 -11.75,-3.075 -11.15,-3.075 -11.15,1.075 11.15,1.075 11.15,-3.075 11.75,-3.075 11.75,-3.925 -11.75,-3.925
Mechanical 15:
  lines w0.05: -12.15,-4.025 12.15,-4.025 12.15,2.075 -12.15,2.075 -12.15,-4.025
  lines w0.1: -0.5,0 0.5,0 ; 0,-0.5 0,0.5
3D body: height 0.25, standoff 0, extent -11.75,-3.925 11.75,1.675